# Altium footprint library Radio Lib.PcbLib: 41 footprints (part 2 of 3)
Each footprint in its own frame and in the unit in brackets; x right, y up, seen from the top. Pads: shape width x height; smd on the part's side, far side on the other; paste and mask are expansions set on the pad; w line width, h text height; cw(c..) or ccw(c..) is an arc to the next point about the centre after c.
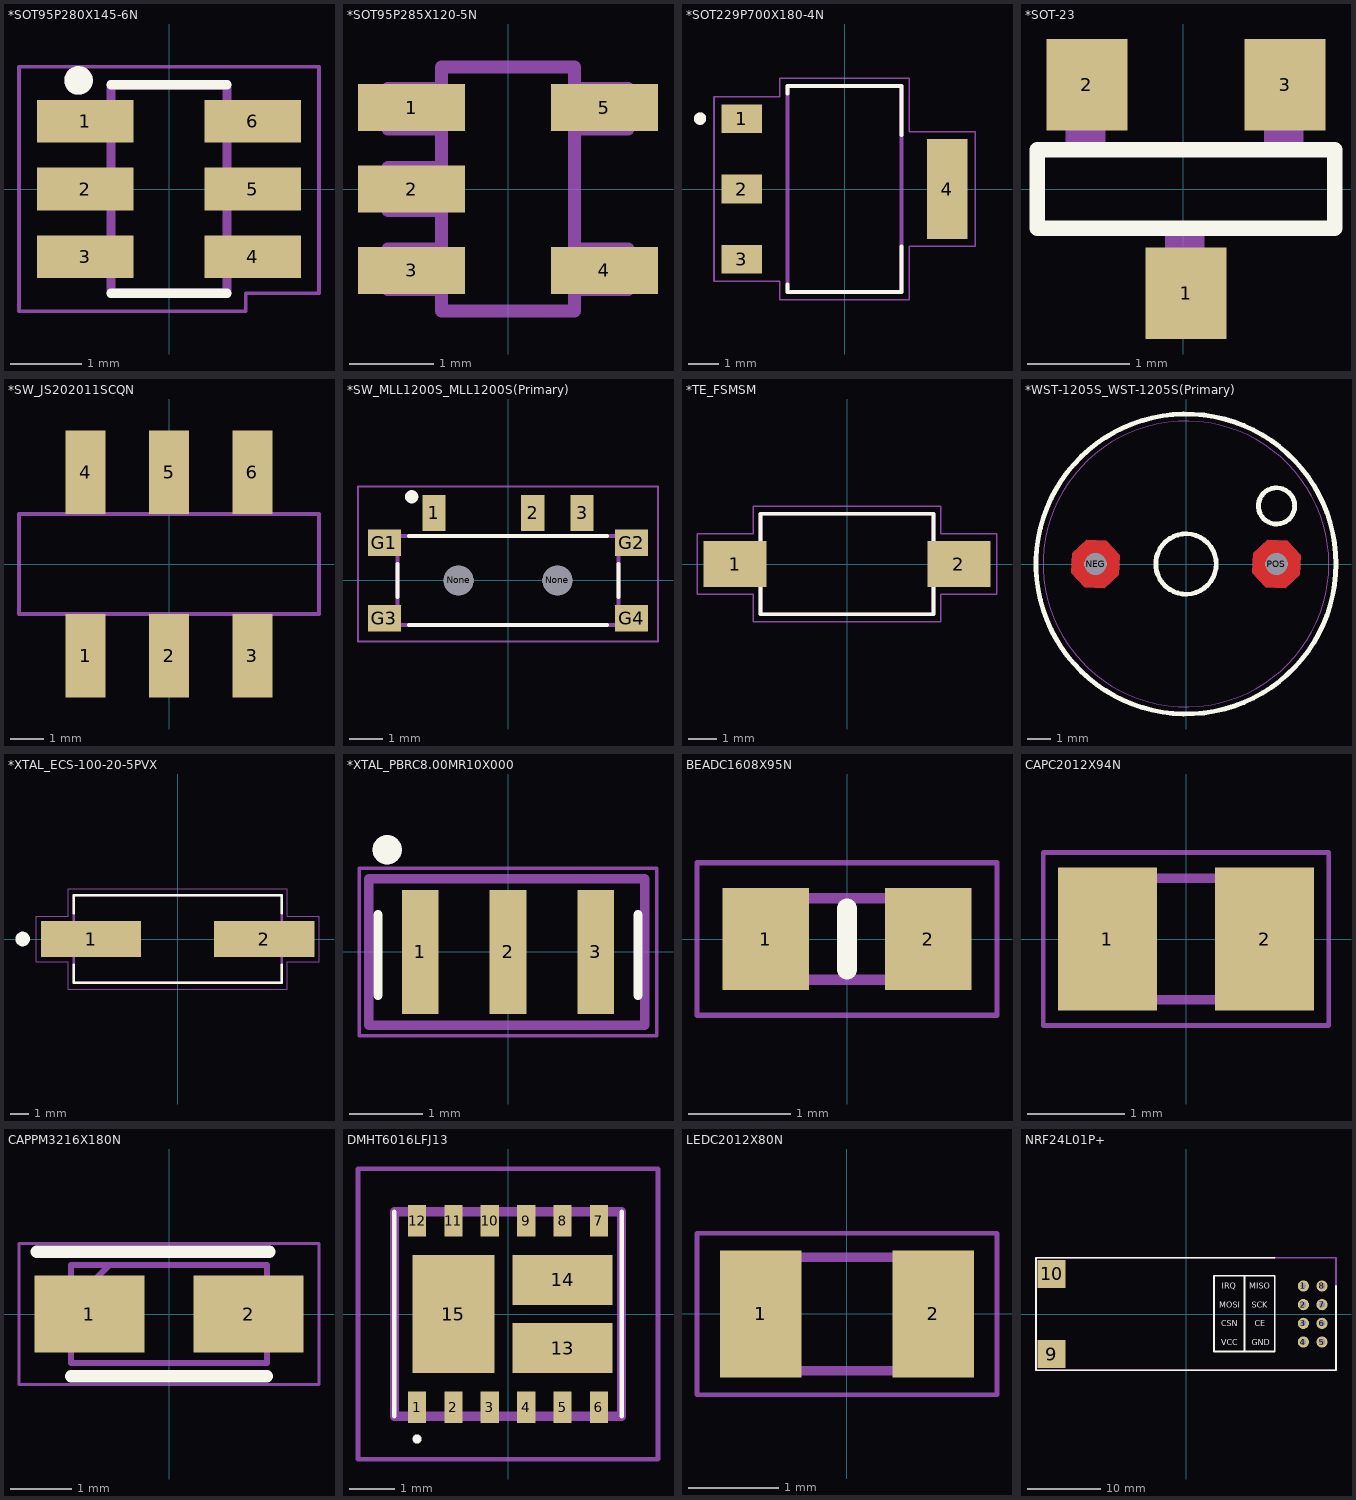
[diagram p1: the footprints below, top view; thin cyan lines are the x and y axes]

## *SOT95P280X145-6N [mm]
pads (6):
  rect 1.36x0.6 smd: 1(-1.175,0.95) 2(-1.175,0) 3(-1.175,-0.95) 4(1.175,-0.95) 5(1.175,0) 6(1.175,0.95)
Top Overlay:
  circle w0.2: c-1.27,1.524 r0.1
  lines w0.127: -0.813,-1.463 0.813,-1.463 ; -0.813,1.463 0.813,1.463
Mechanical 4:
  circle w0.2: c-1.27,1.524 r0.1
  circle w0.2: c-1.27,1.524 r0.1
  lines w0.127: -0.813,-1.463 -0.813,1.463 ; -0.813,-1.463 0.813,-1.463 ; -0.813,-1.463 -0.813,1.463 ; -0.813,-1.463 0.813,-1.463 ; -0.813,1.463 0.813,1.463 ; -0.813,1.463 0.813,1.463 ; 0.813,-1.463 0.813,1.463 ; 0.813,-1.463 0.813,1.463
Mechanical 16:
  lines w0.05: -2.105,-1.713 -2.105,1.713 2.105,1.713 2.105,-1.46 1.08,-1.46 1.08,-1.713 -2.105,-1.713
3D body "USBLC6-2SC6Y--3DModel-STEP-56544.STEP": height 1.42, standoff -0.03, extent -1.425,-1.462 1.375,1.463

## *SOT95P285X120-5N [mil]
pads (5):
  rect 50x22 smd: 1(-45,38) 2(-45,0) 3(-45,-38) 4(45,-38) 5(45,38)
Mechanical 4:
  lines w6: -56,-47 -31,-47 ; -56,-47 -56,-28 ; -56,-47 -31,-47 ; -56,-47 -56,-28 ; -56,-28 -31,-28 ; -56,-28 -31,-28 ; -56,-10 -31,-10 ; -56,-10 -56,10 ; -56,-10 -31,-10 ; -56,-10 -56,10 ; -56,10 -31,10 ; -56,10 -31,10 ; -56,28 -31,28 ; -56,28 -56,47 ; -56,28 -31,28 ; -56,28 -56,47 ; -56,47 -31,47 ; -56,47 -31,47 ; -31,-57 -31,57 ; -31,-57 31,-57 ; -31,-57 -31,57 ; -31,-57 31,-57 ; -31,-47 -31,-28 ; -31,-47 -31,-28 ; -31,-10 -31,10 ; -31,-10 -31,10 ; -31,28 -31,47 ; -31,28 -31,47 ; -31,57 31,57 ; -31,57 31,57 ; 31,-57 31,57 ; 31,-57 31,57 ; 31,-47 56,-47 ; 31,-47 31,-28 ; 31,-47 56,-47 ; 31,-47 31,-28 ; 31,-28 56,-28 ; 31,-28 56,-28 ; 31,28 56,28 ; 31,28 31,47 ; 31,28 56,28 ; 31,28 31,47 ; 31,47 56,47 ; 31,47 56,47 ; 56,-47 56,-28 ; 56,-47 56,-28 ; 56,28 56,47 ; 56,28 56,47
3D body "SOT-23-5.stp": height 39.37, standoff 0, extent -47.24,-57.49 47.25,56.69

## *SOT229P700X180-4N [mm]
pads (4):
  rect 1.31x0.93 smd: 1(-3.345,2.29) 2(-3.345,0) 3(-3.345,-2.29)
  rect 1.31x3.24 smd: 4(3.345,0)
Top Overlay:
  circle w0.2: c-4.703,2.29 r0.1
  lines w0.127: -1.86,-3.11 -1.86,-3.36 1.86,-3.36 1.86,-1.87 ; -1.86,3.1 -1.86,3.36 1.86,3.36 1.86,1.76
Mechanical 4:
  circle w0.2: c-4.703,2.29 r0.1
  circle w0.2: c-4.703,2.29 r0.1
  lines w0.127: -1.86,-3.36 1.86,-3.36 ; -1.86,-3.36 -1.86,3.36 ; -1.86,-3.36 1.86,-3.36 ; -1.86,-3.36 -1.86,3.36 ; -1.86,3.36 1.86,3.36 ; -1.86,3.36 1.86,3.36 ; 1.86,-3.36 1.86,3.36 ; 1.86,-3.36 1.86,3.36
Mechanical 16:
  lines w0.05: -4.25,-3.01 -4.25,3.01 -2.11,3.01 -2.11,3.61 2.11,3.61 2.11,1.87 4.25,1.87 4.25,-1.87 2.11,-1.87 2.11,-3.61 -2.11,-3.61 -2.11,-3.01 -4.25,-3.01
3D body "AMS1117-3.3--3DModel-STEP-56544.STEP": height 1.78, standoff -0.03, extent -3.626,-3.251 3.372,3.251

## *SOT-23 [mil]
pads (3):
  rect 31x35 smd: 1(1,-40) 2(-37,40) 3(39,40)
Top Overlay:
  lines w6: -56,-15 -56,15 58,15 58,-15 -56,-15
Mechanical 4:
  region: -7.01,-17 8,-17 8,-37.06 -7.01,-37.06
  region: -45.05,37 -30,37 -30,17.02 -45.05,17.02
  region: 31.04,37 46,37 46,17.02 31.04,17.02
  region: -7.01,-17 8,-17 8,-37.06 -7.01,-37.06
  region: -45.05,37 -30,37 -30,17.02 -45.05,17.02
  region: 31.04,37 46,37 46,17.02 31.04,17.02
3D body "ZC934ATA--3DModel-STEP-56544.STEP": height 42.52, standoff -0.79, extent -56.3,-45.27 56.3,45.28

## *SW_JS202011SCQN [mm]
pads (6):
  rect 1.2x2.5 smd: 1(-2.5,-2.75) 2(0,-2.75) 3(2.5,-2.75) 4(-2.5,2.75) 5(0,2.75) 6(2.5,2.75)
Mechanical 4:
  lines w0.127: -4.5,-1.5 4.5,-1.5 ; -4.5,-1.5 -4.5,1.5 ; -4.5,-1.5 4.5,-1.5 ; -4.5,-1.5 -4.5,1.5 ; -4.5,1.5 4.5,1.5 ; -4.5,1.5 4.5,1.5 ; 4.5,-1.5 4.5,1.5 ; 4.5,-1.5 4.5,1.5
3D body "JS202011SCQN--3DModel-STEP-56544.STEP": height 5.51, standoff 0, extent -4.496,-3.747 4.496,3.747

## *SW_MLL1200S_MLL1200S(Primary) [mm]
pads (9):
  rect 0.7x1.1 smd: 1(-2.25,2.05) 2(0.75,2.05) 3(2.25,2.05)
  rect 1x0.8 smd: G1(-3.75,1.15) G2(3.75,1.15) G3(-3.75,-1.15) G4(3.75,-1.15)
  round 0.9 hole 0.9 unplated: None(-1.5,0) None(1.5,0)
Top Overlay:
  circle w0.2: c-2.921,2.54 r0.1
  lines w0.127: -3.35,-0.5 -3.35,0.5 ; -3,-1.35 3,-1.35 ; -3,1.35 3,1.35 ; 3.35,-0.5 3.35,0.5
Mechanical 4:
  lines w0.127: -3.35,-1.35 3.35,-1.35 ; -3.35,-1.35 -3.35,1.35 ; -3.35,-1.35 3.35,-1.35 ; -3.35,-1.35 -3.35,1.35 ; -3.35,1.35 3.35,1.35 ; -3.35,1.35 3.35,1.35 ; 3.35,-1.35 3.35,1.35 ; 3.35,-1.35 3.35,1.35
Mechanical 16:
  lines w0.05: -4.55,-1.85 -4.55,2.85 4.55,2.85 4.55,-1.85 0.25,-1.85 -1.75,-1.85 -4.55,-1.85
3D body "MLL1200S--3DModel-STEP-56544.STEP": height 1.5, standoff -0.6, extent -3.85,-2.85 3.85,2.25

## *TE_FSMSM [mm]
pads (2):
  rect 2.19x1.6 smd: 1(-3.886,0) 2(3.886,0)
Top Overlay:
  lines w0.127: -3,-1.75 -3,1.75 3,1.75 3,-1.75 -3,-1.75
Mechanical 4:
  lines w0.127: -3,-1.75 -3,1.75 ; -3,-1.75 3,-1.75 ; -3,-1.75 -3,1.75 ; -3,-1.75 3,-1.75 ; -3,1.75 3,1.75 ; -3,1.75 3,1.75 ; 3,-1.75 3,1.75 ; 3,-1.75 3,1.75
Mechanical 16:
  lines w0.05: -5.207,-1.05 -3.25,-1.05 -3.25,-2 3.25,-2 3.25,-1.05 5.207,-1.05 5.207,1.05 3.25,1.05 3.25,2 -3.25,2 -3.25,1.05 -5.207,1.05 -5.207,-1.05
3D body "6x3mm Button.stp": height 2.54, standoff -0.03, extent -3.886,-1.791 3.886,1.791

## *WST-1205S_WST-1205S(Primary) [mil]
pads (2):
  round 36 hole 36: NEG(-149.61,0) POS(149.61,0)
Top Layer:
  region: -109.67,14.54 -131.65,38.52 -164.14,39.94 -188.12,17.96 -189.54,-14.54 -167.57,-38.52 -135.07,-39.94 -111.09,-17.96
  region: 189.54,14.54 167.57,38.52 135.07,39.94 111.09,17.96 109.67,-14.54 131.65,-38.52 164.14,-39.94 188.12,-17.96
Bottom Layer:
  region: -109.67,14.54 -131.65,38.52 -164.14,39.94 -188.12,17.96 -189.54,-14.54 -167.57,-38.52 -135.07,-39.94 -111.09,-17.96
  region: 189.54,14.54 167.57,38.52 135.07,39.94 111.09,17.96 109.67,-14.54 131.65,-38.52 164.14,-39.94 188.12,-17.96
Top Overlay:
  circle w8: c149.69,96.06 r30
  circle w8: c0,0 r248.03
  circle w8: c0,0 r50
Mechanical 4:
  circle w2: c0,0 r236.22
  circle w2: c0,0 r236.22
Multi-Layer:
  region: -109.67,14.54 -131.65,38.52 -164.14,39.94 -188.12,17.96 -189.54,-14.54 -167.57,-38.52 -135.07,-39.94 -111.09,-17.96
  region: 189.54,14.54 167.57,38.52 135.07,39.94 111.09,17.96 109.67,-14.54 131.65,-38.52 164.14,-39.94 188.12,-17.96
3D body "WST-1205S--3DModel-STEP-56544.STEP": height 393.7, standoff -157.48, extent -236.22,-236.21 236.22,236.23

## *XTAL_ECS-100-20-5PVX [mm]
pads (2):
  rect 5.5x2 smd: 1(-4.75,0) 2(4.75,0)
Top Overlay:
  circle w0.4: c-8.5,0 r0.2
  lines w0.127: -5.7,-1.41 -5.7,-2.4 5.7,-2.4 5.7,-1.41 ; -5.7,1.41 -5.7,2.4 5.7,2.4 5.7,1.41
Mechanical 4:
  circle w0.4: c-6.75,0 r0.2
  circle w0.4: c-6.75,0 r0.2
  lines w0.127: -5.7,-2.4 -5.7,2.4 ; -5.7,-2.4 5.7,-2.4 ; -5.7,-2.4 -5.7,2.4 ; -5.7,-2.4 5.7,-2.4 ; -5.7,2.4 5.7,2.4 ; -5.7,2.4 5.7,2.4 ; 5.7,-2.4 5.7,2.4 ; 5.7,-2.4 5.7,2.4
Mechanical 16:
  lines w0.05: -7.75,-1.25 -6,-1.25 -6,-2.75 6,-2.75 6,-1.25 7.75,-1.25 7.75,1.25 6,1.25 6,2.75 -6,2.75 -6,1.25 -7.75,1.25 -7.75,-1.25
3D body "HC-49SM.stp": height 4, standoff 0, extent -6.7,-2.4 6.7,2.4

## *XTAL_PBRC8.00MR10X000 [mm]
pads (3):
  rect 0.5x1.7 smd: 1(-1.2,0) 2(0,0) 3(1.2,0)
Top Overlay:
  circle w0.2: c-1.651,1.397 r0.1
  lines w0.127: -1.778,-0.592 -1.778,0.508 ; 1.778,-0.592 1.778,0.508
Mechanical 4:
  circle w0.2: c-1.651,1.397 r0.1
  circle w0.2: c-1.651,1.397 r0.1
  lines w0.127: -1.905,-1 1.869,-1 1.869,1 -1.905,1 -1.905,-1
Mechanical 16:
  lines w0.05: -2.032,-1.143 2.032,-1.143 2.032,1.143 -2.032,1.143 -2.032,-1.143
3D body "ceramic-resonator-smd-3mm2x1mm3-muratea-cstce.stp": height 0.7, standoff 0, extent -1.6,-0.65 1.6,0.65

## BEADC1608X95N [mm]
pads (2):
  rect 0.85x1 smd: 1(-0.8,0) 2(0.8,0)
Top Overlay:
  lines w0.2: 0,-0.3 0,0.3
Mechanical 13:
  lines w0.1: -0.8,-0.4 -0.8,0.4 0.8,0.4 0.8,-0.4 -0.8,-0.4
Mechanical 15:
  lines w0.05: -1.475,-0.75 -1.475,0.75 1.475,0.75 1.475,-0.75 -1.475,-0.75
3D body "BLM18AG102SH1D.stp": height 0.95, standoff 0, extent -0.8,-0.4 0.8,0.4

## CAPC2012X94N [mm]
pads (2):
  rect 1.02x1.47 smd: 1(-0.81,0) 2(0.81,0)
Mechanical 13:
  lines w0.1: -1.005,-0.625 -1.005,0.625 1.005,0.625 1.005,-0.625 -1.005,-0.625
Mechanical 15:
  lines w0.05: -1.47,-0.89 -1.47,0.89 1.47,0.89 1.47,-0.89 -1.47,-0.89
3D body "08055A101JAT2A.stp": height 0.94, standoff 0, extent -1.005,-0.625 1.005,0.625

## CAPPM3216X180N [mm]
pads (2):
  rect 1.8x1.25 smd: 1(-1.3,0) 2(1.3,0)
Top Overlay:
  lines w0.2: -2.159,1.016 1.641,1.016 ; -1.6,-1.016 1.6,-1.016
Mechanical 13:
  lines w0.1: -1.6,0.175 -0.975,0.8 ; -1.6,-0.8 1.6,-0.8 1.6,0.8 -1.6,0.8 -1.6,-0.8
Mechanical 15:
  lines w0.05: -2.45,-1.15 2.45,-1.15 2.45,1.15 -2.45,1.15 -2.45,-1.15
3D body "293D104X9035A2TE3.stp": height 1.8, standoff 0, extent -1.6,-0.8 1.6,0.8

## DMHT6016LFJ13 [mm]
pads (15):
  rect 0.4x0.7 smd: 1(-2,-2.05) 2(-1.2,-2.05) 3(-0.4,-2.05) 4(0.4,-2.05) 5(1.2,-2.05) 6(2,-2.05) 7(2,2.05) 8(1.2,2.05) 9(0.4,2.05) 10(-0.4,2.05) 11(-1.2,2.05) 12(-2,2.05)
  rect 2.2x1.1 smd: 13(1.2,-0.75) 14(1.2,0.75)
  rect 1.8x2.6 smd: 15(-1.2,0)
Top Overlay:
  lines w0.1: -2.5,-2.25 -2.5,2.25 ; 2.5,-2.25 2.5,2.25 ; -2,-2.8 ccw(c-2,-2.75) -2,-2.7 ccw(c-2,-2.75) -2,-2.8
Mechanical 13:
  lines w0.2: -2.5,-2.25 -2.5,2.25 2.5,2.25 2.5,-2.25 -2.5,-2.25
Mechanical 15:
  lines w0.1: -3.3,-3.2 -3.3,3.2 3.3,3.2 3.3,-3.2 -3.3,-3.2
3D body "DMHT6016LFJ-13.stp": height 0.9, standoff 0, extent -2.5,-2.36 2.5,2.36

## LEDC2012X80N [mm]
pads (2):
  rect 0.9x1.4 smd: 1(-0.95,0) 2(0.95,0)
Mechanical 13:
  lines w0.1: -1,0.208 -0.583,0.625 ; -1,-0.625 -1,0.625 1,0.625 1,-0.625 -1,-0.625
Mechanical 15:
  lines w0.05: -1.651,-0.889 -1.651,0.889 1.651,0.889 1.651,-0.889 -1.651,-0.889
3D body "0805 Chip SMD LED (2x1.2mm).STEP": height 0.8, standoff 0, extent -1,-0.625 1,0.625

## NRF24L01P+ [mil]
pads (10):
  round 60 hole 30: 1(628.35,150) 2(628.35,50) 3(628.35,-50) 4(628.35,-150) 5(728.35,-150) 6(728.35,-50) 7(728.35,50) 8(728.35,150)
  rect 150x150 smd: 9(-720,-215) 10(-720,215)
Top Overlay:
  lines w10: 312.5,-200 312.5,205 ; 475,301.18 -803.15,301.18 -803.15,-301.18 803.15,-301.18 803.15,150 ; 150,-200 150,205 475,205 475,-200 150,-200
  text "CE" at 367.09,-65.99 h32
  text "CSN" at 188.6,-65.99 h32
  text "SCK" at 351.1,34.01 h32
  text "MISO" at 337.77,134.01 h32
  text "MOSI" at 177.93,34.01 h32
  text "IRQ" at 191.26,134.01 h32
  text "GND" at 351.1,-165.99 h32
  text "VCC" at 188.6,-165.99 h32
Mechanical 4:
  lines w10: -803.15,-301.18 -803.15,301.18 803.15,301.18 803.15,-301.18 -803.15,-301.18
3D body "NRF24l01_with_antenna.STEP": height 3663.32, standoff -222.05, extent -2098.39,-300.2 815,300.2